# Altium footprint library AltiumLibraries.PcbLib: 247 footprints (part 14 of 16)
Each footprint in its own frame and in the unit in brackets; x right, y up, seen from the top. Pads: shape width x height; smd on the part's side, far side on the other; paste and mask are expansions set on the pad; w line width, h text height; cw(c..) or ccw(c..) is an arc to the next point about the centre after c.
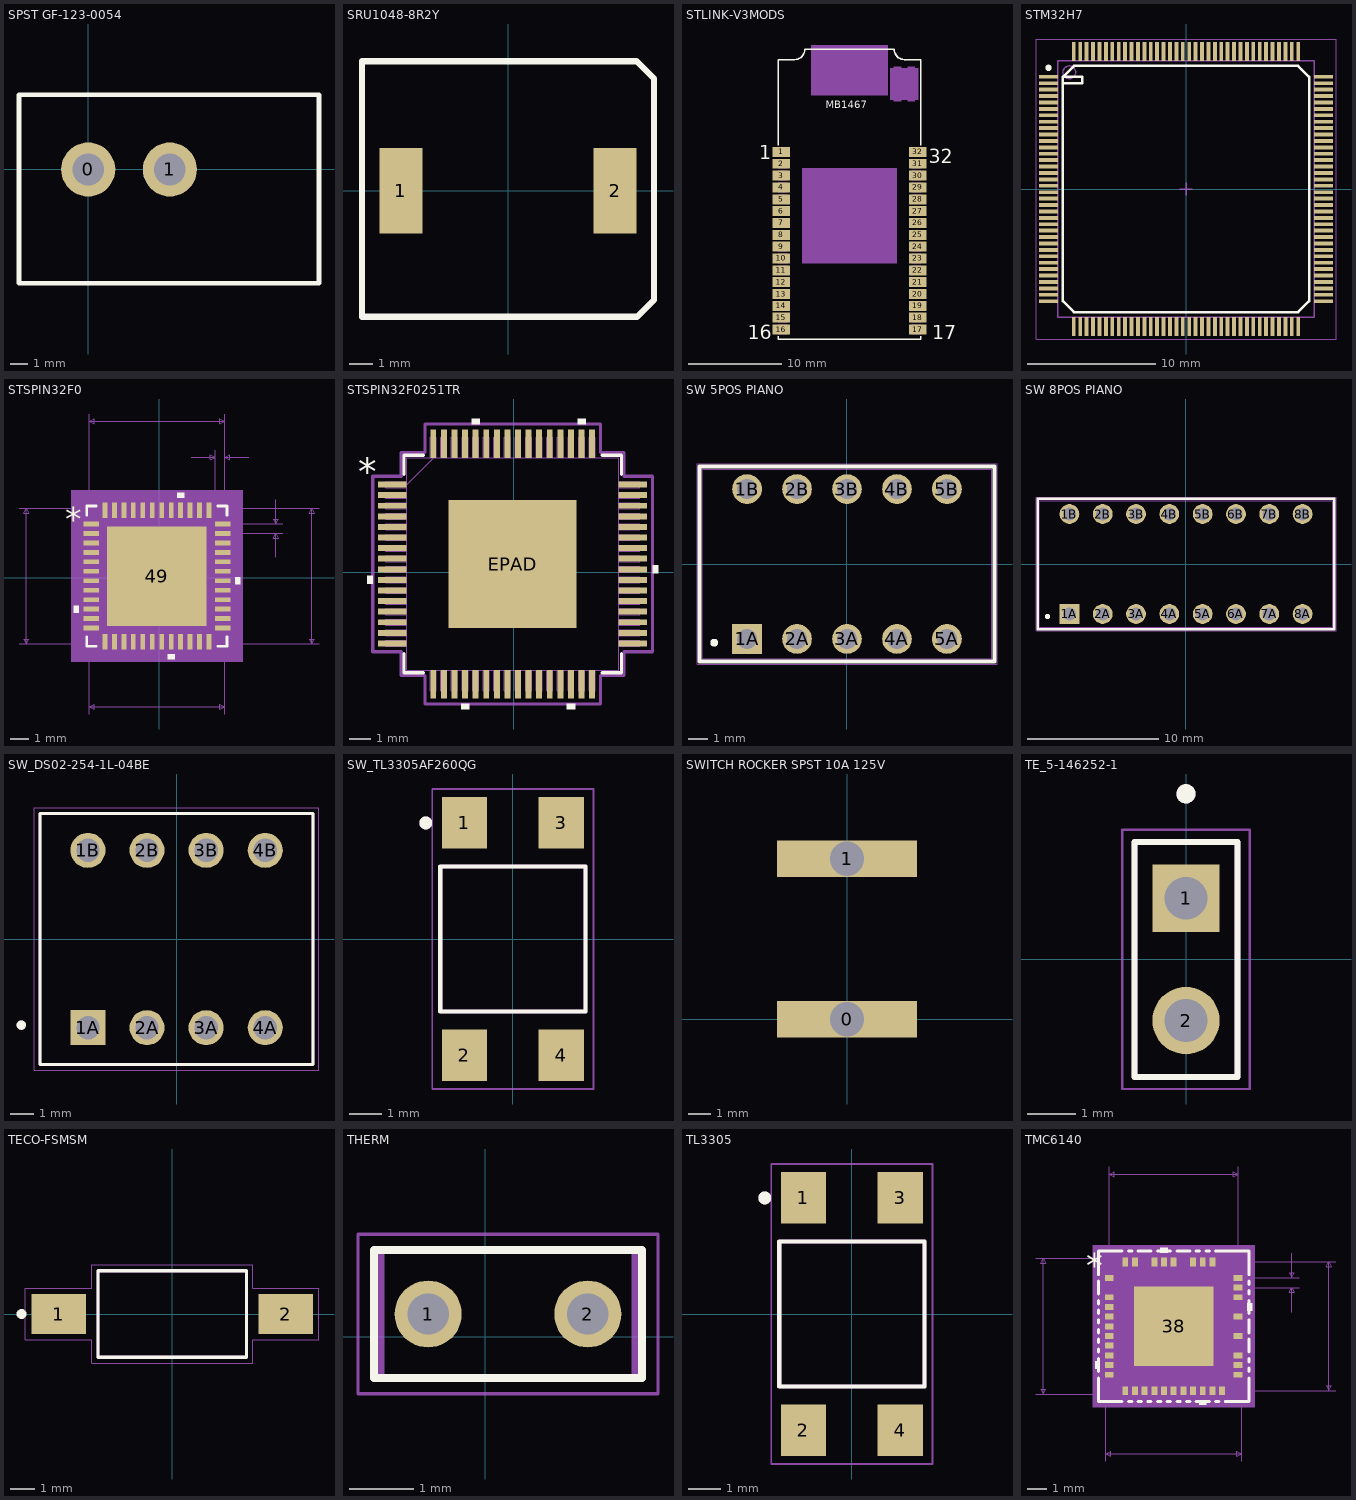
[diagram p13: the footprints below, top view; thin cyan lines are the x and y axes]

## SPST GF-123-0054 [mil]
pads (2):
  round 120 hole 70: 0(0,0) 1(181,0)
Top Overlay:
  lines w10: -153.54,-251.97 511.81,-251.97 511.81,165.35 -153.54,165.35 -153.54,-251.97
3D body "GF-123-0054--3DModel-STEP-56544.STEP": height 589, standoff -160, extent -144.86,-243.3 503.14,156.7

## SRU1048-8R2Y [mil]
pads (2):
  rect 71x142 smd: 1(-177,0) 2(177,0)
Top Overlay:
  lines w10: -241.5,-208.27 213.39,-208.27 241.5,-180.15 241.5,185.27 212.6,214.17 -241.5,214.17 -241.5,0 -241.5,-208.27

## STLINK-V3MODS [mil] "STLINK V3 COMPACT IN-CIRCUIT DEB"
pads (32):
  rect 74.8x42.13 smd: 1(1921.81,-4560) 2(1921.81,-4610) 3(1921.81,-4660) 4(1921.81,-4710) 5(1921.81,-4760) 6(1921.81,-4810) 7(1921.81,-4860) 8(1921.81,-4910) 9(1921.81,-4960) 10(1921.81,-5010) 11(1921.81,-5060) 12(1921.81,-5110) 13(1921.81,-5160) 14(1921.81,-5210) 15(1921.81,-5260) 16(1921.81,-5310) 17(2498.19,-5310) 18(2498.19,-5260) 19(2498.19,-5210) 20(2498.19,-5160) 21(2498.19,-5110) 22(2498.19,-5060) 23(2498.19,-5010) 24(2498.19,-4960) 25(2498.19,-4910) 26(2498.19,-4860) 27(2498.19,-4810) 28(2498.19,-4760) 29(2498.19,-4710) 30(2498.19,-4660) 31(2498.19,-4610) 32(2498.19,-4560)
Top Overlay:
  lines w6: 1910,-5338 1910,-5350 2510,-5350 2510,-5338 ; 1910,-4532 1910,-4170 1978,-4170 ccw(c1978,-4127) 2021,-4127 2399,-4127 ccw(c2442,-4127) 2442,-4170 2510,-4170 2510,-4532
  text "MB1467" at 2110,-4376 h31
  text "32" at 2545,-4608 h59
  text "17" at 2560,-5350 h59
  text "16" at 1780,-5350 h59
  text "1" at 1830,-4590 h59
Mechanical 15:
  drawing of 291 lines, arcs and shapes, not listed

## STM32H7 [mm] "STM32H743ZI 144 pin"
height 1.6
pads (144):
  rect 0.3x1.45 smd: BOOT0(-5.75,10.725) PA3(-8.75,-10.725) PA4(-7.25,-10.725) PA5(-6.75,-10.725) PA6(-6.25,-10.725) PA7(-5.75,-10.725) PA14(8.75,10.725) PA15(8.25,10.725) PB0(-4.25,-10.725) PB1(-3.75,-10.725) PB2(-3.25,-10.725) PB3(-3.25,10.725) PB4(-3.75,10.725) PB5(-4.25,10.725) PB6(-4.75,10.725) PB7(-5.25,10.725) PB8(-6.25,10.725) PB9(-6.75,10.725) PB10(7.25,-10.725) PB11(7.75,-10.725) PC4(-5.25,-10.725) PC5(-4.75,-10.725) PC10(7.75,10.725) PC11(7.25,10.725) PC12(6.75,10.725) PD0(6.25,10.725) PD1(5.75,10.725) PD2(5.25,10.725) PD3(4.75,10.725) PD4(4.25,10.725) PD5(3.75,10.725) PD6(2.25,10.725) PD7(1.75,10.725) PDR_ON(-8.25,10.725) PE0(-7.25,10.725) PE1(-7.75,10.725) PE7(1.75,-10.725) PE8(2.25,-10.725) PE9(2.75,-10.725) PE10(4.25,-10.725) PE11(4.75,-10.725) PE12(5.25,-10.725) PE13(5.75,-10.725) PE14(6.25,-10.725) PE15(6.75,-10.725) PF11(-2.75,-10.725) PF12(-2.25,-10.725) PF13(-0.75,-10.725) PF14(-0.25,-10.725) PF15(0.25,-10.725) PG0(0.75,-10.725) PG1(1.25,-10.725) PG9(1.25,10.725) PG10(0.75,10.725) PG11(0.25,10.725) PG12(-0.25,10.725) PG13(-0.75,10.725) PG14(-1.25,10.725) PG15(-2.75,10.725) VCAP(8.25,-10.725) VDD(-8.75,10.725) VDD(-7.75,-10.725) VDD(-2.25,10.725) VDD(-1.25,-10.725) VDD(2.75,10.725) VDD(3.75,-10.725) VDD(8.75,-10.725) VSS(-8.25,-10.725) VSS(-1.75,-10.725) VSS(-1.75,10.725) VSS(3.25,-10.725) VSS(3.25,10.725)
  rect 1.45x0.3 smd: NRST(-10.725,-3.25) PA0(-10.725,-7.75) PA1(-10.725,-8.25) PA2(-10.725,-8.75) PA8(10.725,4.75) PA9(10.725,5.25) PA10(10.725,5.75) PA11(10.725,6.25) PA12(10.725,6.75) PA13(10.725,7.25) PB12(10.725,-8.75) PB13(10.725,-8.25) PB14(10.725,-7.75) PB15(10.725,-7.25) PC0(-10.725,-3.75) PC1(-10.725,-4.25) PC2(-10.725,-4.75) PC3(-10.725,-5.25) PC6(10.725,2.75) PC7(10.725,3.25) PC8(10.725,3.75) PC9(10.725,4.25) PC13(-10.725,5.75) PC14(-10.725,5.25) PC15(-10.725,4.75) PD8(10.725,-6.75) PD9(10.725,-6.25) PD10(10.725,-5.75) PD11(10.725,-5.25) PD12(10.725,-4.75) PD13(10.725,-4.25) PD14(10.725,-2.75) PD15(10.725,-2.25) PE2(-10.725,8.75) PE3(-10.725,8.25) PE4(-10.725,7.75) PE5(-10.725,7.25) PE6(-10.725,6.75) PF0(-10.725,4.25) PF1(-10.725,3.75) PF2(-10.725,3.25) PF3(-10.725,2.75) PF4(-10.725,2.25) PF5(-10.725,1.75) PF6(-10.725,0.25) PF7(-10.725,-0.25) PF8(-10.725,-0.75) PF9(-10.725,-1.25) PF10(-10.725,-1.75) PG2(10.725,-1.75) PG3(10.725,-1.25) PG4(10.725,-0.75) PG5(10.725,-0.25) PG6(10.725,0.25) PG7(10.725,0.75) PG8(10.725,1.25) PH0(-10.725,-2.25) PH1(-10.725,-2.75) VBAT(-10.725,6.25) VCAP(10.725,7.75) VDD(-10.725,-5.75) VDD(-10.725,0.75) VDD(10.725,-3.25) VDD(10.725,8.75) VDD33USB(10.725,2.25) VDDA(-10.725,-7.25) VREF+(-10.725,-6.75) VSS(-10.725,1.25) VSS(10.725,-3.75) VSS(10.725,1.75) VSS(10.725,8.25) VSSA(-10.725,-6.25)
Top Overlay:
  circle w0.25: c-10.725,9.45 r0.125
  lines w0.2: -9.6,8.25 -8.1,8.25 -8.1,8.75 -9.6,8.75 ; -9.6,8.75 -8.75,9.6 8.75,9.6 9.6,8.75 9.6,-8.75 8.75,-9.6 -8.75,-9.6 -9.6,-8.75 -9.6,8.75
Mechanical 13:
  circle w0.1: c-9.1,9.1 r0.5
  lines w0.1: -10,-10 10,-10 10,10 -10,10 -10,-10
Mechanical 15:
  lines w0.05: -11.7,-11.7 11.7,-11.7 11.7,11.7 -11.7,11.7 -11.7,-11.7
  lines w0.1: -0.5,0 0.5,0 ; 0,-0.5 0,0.5
3D body: height 0.25, standoff 0, extent -2.54,-2.537 2.54,2.537

## STSPIN32F0 [mil]
pads (49):
  rect 32x10 smd paste+0 mask+0: 1(-141.21,111.61) 2(-141.21,91.93) 3(-141.21,72.24) 4(-141.21,52.56) 5(-141.21,32.87) 6(-141.21,13.19) 7(-141.21,-6.5) 8(-141.21,-26.18) 9(-141.21,-45.87) 10(-141.21,-65.55) 11(-141.21,-85.24) 12(-141.21,-104.92) 25(132.79,-104.92) 26(132.79,-85.24) 27(132.79,-65.55) 28(132.79,-45.87) 29(132.79,-26.18) 30(132.79,-6.5) 31(132.79,13.19) 32(132.79,32.87) 33(132.79,52.56) 34(132.79,72.24) 35(132.79,91.93) 36(132.79,111.61)
  rect 10x32 smd paste+0 mask+0: 13(-112.48,-133.65) 14(-92.8,-133.65) 15(-73.11,-133.65) 16(-53.43,-133.65) 17(-33.74,-133.65) 18(-14.06,-133.65) 19(5.63,-133.65) 20(25.32,-133.65) 21(45,-133.65) 22(64.69,-133.65) 23(84.37,-133.65) 24(104.06,-133.65) 37(104.06,140.35) 38(84.37,140.35) 39(64.69,140.35) 40(45,140.35) 41(25.32,140.35) 42(5.63,140.35) 43(-14.06,140.35) 44(-33.74,140.35) 45(-53.43,140.35) 46(-73.11,140.35) 47(-92.8,140.35) 48(-112.48,140.35)
  rect 207x207 smd paste-103 mask+0: 49(-4.21,3.35)
Top Overlay:
  region: -167.21,-58.05 -177.21,-58.05 -177.21,-73.05 -167.21,-73.05
  region: 32.81,-159.65 17.82,-159.65 17.82,-169.65 32.81,-169.65
  region: 158.79,1 168.79,1 168.79,-14 158.79,-14
  region: 52.5,166.35 37.5,166.35 37.5,176.35 52.5,176.35
  lines w6: -150.21,-123.02 -150.21,-142.65 -130.58,-142.65 ; -150.21,129.71 -150.21,149.35 -130.58,149.35 ; 122.16,-142.65 141.79,-142.65 141.79,-123.02 ; 122.16,149.35 141.79,149.35 141.79,129.71
  text "*" at -194.71,96.46 h50
Top Paste:
  region: -59.9,102.91 -103.78,102.91 -103.78,59.03 -59.9,59.03
  region: -59.9,51.16 -103.78,51.16 -103.78,7.28 -59.9,7.28
  region: -59.9,-0.59 -103.78,-0.59 -103.78,-44.47 -59.9,-44.47
  region: -59.9,-52.34 -103.78,-52.34 -103.78,-96.22 -59.9,-96.22
  region: -8.15,102.91 -52.03,102.91 -52.03,59.03 -8.15,59.03
  region: -8.15,51.16 -52.03,51.16 -52.03,7.28 -8.15,7.28
  region: -8.15,-0.59 -52.03,-0.59 -52.03,-44.47 -8.15,-44.47
  region: -8.15,-52.34 -52.03,-52.34 -52.03,-96.22 -8.15,-96.22
  region: 43.6,102.91 -0.28,102.91 -0.28,59.03 43.6,59.03
  region: 43.6,51.16 -0.28,51.16 -0.28,7.28 43.6,7.28
  region: 43.6,-0.59 -0.28,-0.59 -0.28,-44.47 43.6,-44.47
  region: 43.6,-52.34 -0.28,-52.34 -0.28,-96.22 43.6,-96.22
  region: 95.35,102.91 51.47,102.91 51.47,59.03 95.35,59.03
  region: 95.35,51.16 51.47,51.16 51.47,7.28 95.35,7.28
  region: 95.35,-0.59 51.47,-0.59 51.47,-44.47 95.35,-44.47
  region: 95.35,-52.34 51.47,-52.34 51.47,-96.22 95.35,-96.22
Mechanical 5:
  region: 173.79,-174.65 -182.21,-174.65 -182.21,181.35 173.79,181.35
Mechanical 7:
  lines w1: -291.21,-137.65 136.79,-137.65 ; -291.21,144.35 136.79,144.35 136.79,-283.65 ; -145.21,-283.65 -145.21,144.35 ; -145.21,111.61 -145.21,340.35 ; 66.79,250.35 116.79,250.35 ; 104.06,-137.65 332.79,-137.65 ; 104.06,144.35 332.79,144.35 ; 116.79,111.61 116.79,265.35 ; 132.79,91.93 257.79,91.93 ; 132.79,111.61 257.79,111.61 ; 136.79,265.35 136.79,111.61 136.79,340.35 ; 186.79,250.35 136.79,250.35 ; 242.79,41.93 242.79,91.93 ; 242.79,161.61 242.79,111.61 ; -276.21,-137.65 -276.21,144.35 ; -276.21,-137.65 -281.21,-127.65 -271.21,-127.65 -276.21,-137.65 ; -276.21,144.35 -281.21,134.35 -271.21,134.35 -276.21,144.35 ; -145.21,-268.65 136.79,-268.65 ; -145.21,-268.65 -135.21,-263.65 -135.21,-273.65 -145.21,-268.65 ; -145.21,325.35 136.79,325.35 ; -145.21,325.35 -135.21,330.35 -135.21,320.35 -145.21,325.35 ; 116.79,250.35 106.79,255.35 106.79,245.35 116.79,250.35 ; 136.79,-268.65 126.79,-263.65 126.79,-273.65 136.79,-268.65 ; 136.79,250.35 146.79,255.35 146.79,245.35 136.79,250.35 ; 136.79,325.35 126.79,330.35 126.79,320.35 136.79,325.35 ; 242.79,91.93 237.79,81.93 247.79,81.93 242.79,91.93 ; 242.79,111.61 237.79,121.61 247.79,121.61 242.79,111.61 ; 317.79,-137.65 317.79,144.35 ; 317.79,-137.65 312.79,-127.65 322.79,-127.65 317.79,-137.65 ; 317.79,144.35 312.79,134.35 322.79,134.35 317.79,144.35
  text "Default Padstyle: RX10Y32D0T" at -354.21,-459.65 h50
  text "Heat Tab Padstyle: RX207Y207D0T" at -391.71,-519.65 h50
  text "Alt 1 Padstyle: OX60Y90D30P" at -341.71,-639.65 h50
  text "Alt 2 Padstyle: OX90Y60D30P" at -341.71,-699.65 h50
  text "0.02in/0.5mm" at 262.79,89.27 h25
  text "0.02in/0.508mm" at 39.29,270.35 h25
  text "0.282in/7.163mm" at -97.96,345.35 h25
  text "0.282in/7.163mm" at 337.79,-9.15 h25
  text "0.282in/7.163mm" at -483.71,-9.15 h25
  text "0.282in/7.163mm" at -97.96,-313.65 h25
Mechanical 13:
  lines w1: -145.21,94.35 -95.21,144.35 ; -145.21,-137.65 136.79,-137.65 136.79,144.35 -145.21,144.35 -145.21,-137.65 ; -145.21,-110.92 -145.21,-98.92 -145.21,-110.92 ; -145.21,-91.24 -145.21,-79.24 -145.21,-91.24 ; -145.21,-71.55 -145.21,-59.55 -145.21,-71.55 ; -145.21,-51.87 -145.21,-39.87 -145.21,-51.87 ; -145.21,-32.18 -145.21,-20.18 -145.21,-32.18 ; -145.21,-12.5 -145.21,-0.5 -145.21,-12.5 ; -145.21,7.19 -145.21,19.19 -145.21,7.19 ; -145.21,26.87 -145.21,38.87 -145.21,26.87 ; -145.21,46.56 -145.21,58.56 -145.21,46.56 ; -145.21,66.24 -145.21,78.24 -145.21,66.24 ; -145.21,85.93 -145.21,97.93 -145.21,85.93 ; -145.21,105.61 -145.21,117.61 -145.21,105.61 ; -118.48,-137.65 -106.48,-137.65 -118.48,-137.65 ; -118.48,144.35 -106.48,144.35 -118.48,144.35 ; -98.8,-137.65 -86.8,-137.65 -98.8,-137.65 ; -98.8,144.35 -86.8,144.35 -98.8,144.35 ; -79.11,-137.65 -67.11,-137.65 -79.11,-137.65 ; -79.11,144.35 -67.11,144.35 -79.11,144.35 ; -59.43,-137.65 -47.43,-137.65 -59.43,-137.65 ; -59.43,144.35 -47.43,144.35 -59.43,144.35 ; -39.74,-137.65 -27.74,-137.65 -39.74,-137.65 ; -39.74,144.35 -27.74,144.35 -39.74,144.35 ; -20.06,-137.65 -8.06,-137.65 -20.06,-137.65 ; -20.06,144.35 -8.06,144.35 -20.06,144.35 ; -0.37,-137.65 11.63,-137.65 -0.37,-137.65 ; -0.37,144.35 11.63,144.35 -0.37,144.35 ; 19.32,-137.65 31.32,-137.65 19.32,-137.65 ; 19.32,144.35 31.32,144.35 19.32,144.35 ; 39,-137.65 51,-137.65 39,-137.65 ; 39,144.35 51,144.35 39,144.35 ; 58.69,-137.65 70.69,-137.65 58.69,-137.65 ; 58.69,144.35 70.69,144.35 58.69,144.35 ; 78.37,-137.65 90.37,-137.65 78.37,-137.65 ; 78.37,144.35 90.37,144.35 78.37,144.35 ; 98.06,-137.65 110.06,-137.65 98.06,-137.65 ; 98.06,144.35 110.06,144.35 98.06,144.35 ; 136.79,-110.92 136.79,-98.92 136.79,-110.92 ; 136.79,-91.24 136.79,-79.24 136.79,-91.24 ; 136.79,-71.55 136.79,-59.55 136.79,-71.55 ; 136.79,-51.87 136.79,-39.87 136.79,-51.87 ; 136.79,-32.18 136.79,-20.18 136.79,-32.18 ; 136.79,-12.5 136.79,-0.5 136.79,-12.5 ; 136.79,7.19 136.79,19.19 136.79,7.19 ; 136.79,26.87 136.79,38.87 136.79,26.87 ; 136.79,46.56 136.79,58.56 136.79,46.56 ; 136.79,66.24 136.79,78.24 136.79,66.24 ; 136.79,85.93 136.79,97.93 136.79,85.93 ; 136.79,105.61 136.79,117.61 136.79,105.61
  text "*" at -137.71,96.46 h50
Mechanical 15:
  region: -127.48,-147.65 -155.21,-147.65 -155.21,-119.92 -167.21,-119.92 -167.21,126.61 -155.21,126.61 -155.21,154.35 -127.48,154.35 -127.48,166.35 119.06,166.35 119.06,154.35 146.79,154.35 146.79,126.61 158.79,126.61 158.79,-119.92 146.79,-119.92 146.79,-147.65 119.06,-147.65 119.06,-159.65 -127.48,-159.65
  lines w6: -167.21,-119.92 -155.21,-119.92 -155.21,-147.65 -127.48,-147.65 -127.48,-159.65 119.06,-159.65 119.06,-147.65 146.79,-147.65 146.79,-119.92 158.79,-119.92 158.79,126.61 146.79,126.61 146.79,154.35 119.06,154.35 119.06,166.35 -127.48,166.35 -127.48,154.35 -155.21,154.35 -155.21,126.61 -167.21,126.61 -167.21,-119.92
3D body "VFQFPN48_7X7X1_STM.step": height 39.09, standoff 0, extent -145.19,-137.64 136.78,144.34
3D body: height 10, standoff 0, extent -4.21,3.35 5.79,13.35

## STSPIN32F0251TR [mil]
pads (65):
  rect 53x11 smd paste+0: 1(-225.51,163.19) 2(-225.51,143.5) 3(-225.51,123.82) 4(-225.51,104.13) 5(-225.51,84.45) 6(-225.51,64.76) 7(-225.51,45.08) 8(-225.51,25.39) 9(-225.51,5.71) 10(-225.51,-13.98) 11(-225.51,-33.66) 12(-225.51,-53.35) 13(-225.51,-73.03) 14(-225.51,-92.72) 15(-225.51,-112.4) 16(-225.51,-132.09) 33(221.49,-132.09) 34(221.49,-112.4) 35(221.49,-92.72) 36(221.49,-73.03) 37(221.49,-53.35) 38(221.49,-33.66) 39(221.49,-13.98) 40(221.49,5.71) 41(221.49,25.39) 42(221.49,45.08) 43(221.49,64.76) 44(221.49,84.45) 45(221.49,104.13) 46(221.49,123.82) 47(221.49,143.5) 48(221.49,163.19)
  rect 11x53 smd paste+0: 17(-149.65,-207.95) 18(-129.96,-207.95) 19(-110.28,-207.95) 20(-90.59,-207.95) 21(-70.91,-207.95) 22(-51.22,-207.95) 23(-31.54,-207.95) 24(-11.85,-207.95) 25(7.83,-207.95) 26(27.52,-207.95) 27(47.2,-207.95) 28(66.89,-207.95) 29(86.57,-207.95) 30(106.26,-207.95) 31(125.94,-207.95) 32(145.63,-207.95) 49(145.63,239.05) 50(125.94,239.05) 51(106.26,239.05) 52(86.57,239.05) 53(66.89,239.05) 54(47.2,239.05) 55(27.52,239.05) 56(7.83,239.05) 57(-11.85,239.05) 58(-31.54,239.05) 59(-51.22,239.05) 60(-70.91,239.05) 61(-90.59,239.05) 62(-110.28,239.05) 63(-129.96,239.05) 64(-149.65,239.05)
  rect 238x238 smd paste-118.5: EPAD(-2.01,15.55)
Top Overlay:
  region: -63.41,275.55 -78.41,275.55 -78.41,285.55 -63.41,285.55
  region: 133.44,275.55 118.44,275.55 118.44,285.55 133.44,285.55
  region: 257.99,13.21 267.99,13.21 267.99,-1.79 257.99,-1.79
  region: 113.76,-244.45 98.76,-244.45 98.76,-254.45 113.76,-254.45
  region: -83.09,-244.45 -98.09,-244.45 -98.09,-254.45 -83.09,-254.45
  region: -262.01,-6.48 -272.01,-6.48 -272.01,-21.48 -262.01,-21.48
  lines w6: -204.01,-150.69 -204.01,-186.45 -168.25,-186.45 ; -204.01,181.79 -204.01,217.55 -168.25,217.55 ; 164.23,-186.45 199.99,-186.45 199.99,-150.69 ; 164.23,217.55 199.99,217.55 199.99,181.79
  text "*" at -289.51,163.03 h50
Top Paste:
  region: 113.06,-47.89 61.43,-47.89 61.43,-99.51 113.06,-99.51
  region: 113.06,11.61 61.43,11.61 61.43,-40.01 113.06,-40.01
  region: 113.06,71.11 61.43,71.11 61.43,19.49 113.06,19.49
  region: 113.06,130.61 61.43,130.61 61.43,78.99 113.06,78.99
  region: 53.56,-47.89 1.93,-47.89 1.93,-99.51 53.56,-99.51
  region: 53.56,11.61 1.93,11.61 1.93,-40.01 53.56,-40.01
  region: 53.56,71.11 1.93,71.11 1.93,19.49 53.56,19.49
  region: 53.56,130.61 1.93,130.61 1.93,78.99 53.56,78.99
  region: -5.94,-47.89 -57.57,-47.89 -57.57,-99.51 -5.94,-99.51
  region: -5.94,11.61 -57.57,11.61 -57.57,-40.01 -5.94,-40.01
  region: -5.94,71.11 -57.57,71.11 -57.57,19.49 -5.94,19.49
  region: -5.94,130.61 -57.57,130.61 -57.57,78.99 -5.94,78.99
  region: -65.44,-47.89 -117.07,-47.89 -117.07,-99.51 -65.44,-99.51
  region: -65.44,11.61 -117.07,11.61 -117.07,-40.01 -65.44,-40.01
  region: -65.44,71.11 -117.07,71.11 -117.07,19.49 -65.44,19.49
  region: -65.44,130.61 -117.07,130.61 -117.07,78.99 -65.44,78.99
Mechanical 13:
  drawing of 261 lines, arcs and shapes, not listed
  text "*" at -196.51,148.03 h50
Mechanical 15:
  lines w6: -262.01,-147.59 -262.01,178.69 -209.01,178.69 -209.01,222.55 -165.15,222.55 -165.15,275.55 161.13,275.55 161.13,222.55 204.99,222.55 204.99,178.69 257.99,178.69 257.99,-147.59 204.99,-147.59 204.99,-191.45 161.13,-191.45 161.13,-244.45 -165.15,-244.45 -165.15,-191.45 -209.01,-191.45 -209.01,-147.59 -262.01,-147.59
3D body: height 10, standoff 0, extent -2.01,15.55 7.99,25.55
3D body "TQFP64_10X10_STM.step": height 47.09, standoff 0, extent -237.98,-220.43 233.98,251.54

## SW 5POS PIANO [mm]
pads (10):
  rect 1.508x1.508 hole 1: 1A(-5.08,-3.81)
  round 1.508 hole 1: 1B(-5.08,3.81) 2A(-2.54,-3.81) 2B(-2.54,3.81) 3A(0,-3.81) 3B(0,3.81) 4A(2.54,-3.81) 4B(2.54,3.81) 5A(5.08,-3.81) 5B(5.08,3.81)
Top Overlay:
  circle w0.2: c-6.75,-4 r0.1
  lines w0.2: -7.5,-4.96 7.5,-4.96 7.5,4.96 -7.5,4.96 -7.5,-4.96
Mechanical 13:
  lines w0.05: -7.366,-4.826 7.366,-4.826 7.366,4.826 -7.366,4.826 -7.366,-4.826
Mechanical 15:
  lines w0.05: -7.625,-5.085 7.625,-5.085 7.625,5.085 -7.625,5.085 -7.625,-5.085

## SW 8POS PIANO [mm]
pads (16):
  rect 1.508x1.508 hole 1: 1A(-8.89,-3.81)
  round 1.508 hole 1: 1B(-8.89,3.81) 2A(-6.35,-3.81) 2B(-6.35,3.81) 3A(-3.81,-3.81) 3B(-3.81,3.81) 4A(-1.27,-3.81) 4B(-1.27,3.81) 5A(1.27,-3.81) 5B(1.27,3.81) 6A(3.81,-3.81) 6B(3.81,3.81) 7A(6.35,-3.81) 7B(6.35,3.81) 8A(8.89,-3.81) 8B(8.89,3.81)
Top Overlay:
  circle w0.2: c-10.56,-4 r0.1
  lines w0.2: -11.31,-4.96 11.31,-4.96 11.31,4.96 -11.31,4.96 -11.31,-4.96
Mechanical 13:
  lines w0.05: -11.176,-4.826 11.176,-4.826 11.176,4.826 -11.176,4.826 -11.176,-4.826
Mechanical 15:
  lines w0.05: -11.435,-5.085 11.435,-5.085 11.435,5.085 -11.435,5.085 -11.435,-5.085
3D body "76psb08t.STEP": height 7.77, standoff -3.3, extent -11.176,-4.826 11.176,4.826

## SW_DS02-254-1L-04BE [mm]
pads (8):
  rect 1.508x1.508 hole 1: 1A(-3.81,-3.81)
  round 1.508 hole 1: 1B(-3.81,3.81) 2A(-1.27,-3.81) 2B(-1.27,3.81) 3A(1.27,-3.81) 3B(1.27,3.81) 4A(3.81,-3.81) 4B(3.81,3.81)
Top Overlay:
  circle w0.2: c-6.67,-3.7 r0.1
  lines w0.127: -5.87,-5.4 -5.87,5.4 5.87,5.4 5.87,-5.4 -5.87,-5.4
Mechanical 13:
  circle w0.2: c-6.67,-3.7 r0.1
  lines w0.127: -5.87,-5.4 -5.87,5.4 5.87,5.4 5.87,-5.4 -5.87,-5.4
Mechanical 15:
  lines w0.05: -6.12,-5.65 6.12,-5.65 6.12,5.65 -6.12,5.65 -6.12,-5.65
3D body "CUI_DEVICES_DS02-254-1L-04BE.step": height 9.46, standoff -3.8, extent -5.867,-7.71 5.863,5.17

## SW_TL3305AF260QG [mm]
pads (4):
  rect 1.4x1.6 smd: 1(-1.5,3.6) 2(-1.5,-3.6) 3(1.5,3.6) 4(1.5,-3.6)
Top Overlay:
  circle w0.2: c-2.7,3.6 r0.1
  lines w0.127: -2.25,-2.25 -2.25,2.25 2.25,2.25 2.25,-2.25 -2.25,-2.25
Mechanical 13:
  circle w0.2: c-2.7,3.6 r0.1
  lines w0.127: -2.25,-2.25 -2.25,2.25 2.25,2.25 2.25,-2.25 -2.25,-2.25
Mechanical 15:
  lines w0.05: -2.5,-4.65 -2.5,4.65 2.5,4.65 2.5,-4.65 -2.5,-4.65
3D body "TL3305AF260QG--3DModel-STEP-1.STEP": height 3.7, standoff -0.1, extent -2.25,-3.75 2.25,3.75

## SWITCH ROCKER SPST 10A 125V [mm]
pads (2):
  rect 6.1x1.6 hole 1.5 square: 0(0,0) 1(0,7)
3D body: height 13.69, standoff 0, extent -7.3,-3.1 7.3,15.9

## TE_5-146252-1 [mm]
pads (2):
  rect 1.398x1.398 hole 0.89: 1(0,1.27)
  round 1.398 hole 0.89: 2(0,-1.27)
Top Overlay:
  circle w0.2: c0,3.44 r0.1
  lines w0.127: -1.07,-2.44 -1.07,2.44 1.07,2.44 1.07,-2.44 -1.07,-2.44
Mechanical 13:
  circle w0.2: c0,3.44 r0.1
  lines w0.127: -1.07,-2.44 -1.07,2.44 1.07,2.44 1.07,-2.44 -1.07,-2.44
Mechanical 15:
  lines w0.05: -1.32,-2.69 -1.32,2.69 1.32,2.69 1.32,-2.69 -1.32,-2.69
3D body "5-146252-1--3DModel-STEP-1.STEP": height 10.58, standoff -2.96, extent -1.067,-2.438 1.067,2.438
3D body "SNT-100-BK-G.stp": height 8.6, standoff 2.5, extent -1.27,-2.388 1.27,2.692

## TECO-FSMSM [mm]
pads (2):
  rect 2.19x1.6 smd: 1(-4.59,0) 2(4.59,0)
Top Overlay:
  circle w0.2: c-6.096,0 r0.1
  lines w0.127: -3,-1.75 -3,1.75 3,1.75 3,-1.75 -3,-1.75
Mechanical 13:
  lines w0.127: -3,-1.75 -3,1.75 3,1.75 3,-1.75 -3,-1.75
Mechanical 15:
  lines w0.05: -5.935,-1.05 -3.25,-1.05 -3.25,-2 3.25,-2 3.25,-1.05 5.935,-1.05 5.935,1.05 3.25,1.05 3.25,2 -3.25,2 -3.25,1.05 -5.935,1.05 -5.935,-1.05

## THERM [mm]
pads (2):
  round 1.05 hole 0.65: 1(-0.894,0.356) 2(1.606,0.356)
Top Overlay:
  lines w0.127: -1.744,-0.644 2.456,-0.644 2.456,1.356 -1.744,1.356 -1.744,-0.644
Mechanical 13:
  lines w0.127: -1.644,-0.644 -1.644,1.356 2.356,1.356 2.356,-0.644 -1.644,-0.644
Mechanical 15:
  lines w0.05: -1.994,-0.894 -1.994,1.606 2.706,1.606 2.706,-0.894 -1.994,-0.894

## TL3305 [mm] "TL3305 SPST-NO"
pads (4):
  rect 1.4x1.6 smd: 1(-1.5,3.6) 2(-1.5,-3.6) 3(1.5,3.6) 4(1.5,-3.6)
Top Overlay:
  circle w0.2: c-2.7,3.6 r0.1
  lines w0.127: -2.25,-2.25 2.25,-2.25 2.25,2.25 -2.25,2.25 -2.25,-2.25
Mechanical 13:
  circle w0.2: c-2.7,3.6 r0.1
  lines w0.127: -2.25,-2.25 2.25,-2.25 2.25,2.25 -2.25,2.25 -2.25,-2.25
Mechanical 15:
  lines w0.05: -2.5,-4.65 2.5,-4.65 2.5,4.65 -2.5,4.65 -2.5,-4.65

## TMC6140 [mil]
pads (38):
  rect 18x12 smd paste-6 mask+0: 1(2024.09,1778.45) 2(2024.09,1739.07) 3(2024.09,1719.38) 4(2024.09,1699.69) 5(2024.09,1680) 6(2024.09,1660.31) 7(2024.09,1640.62) 8(2024.09,1620.93) 9(2024.09,1601.24) 10(2024.09,1581.55) 22(2285.91,1581.55) 23(2285.91,1601.24) 24(2285.91,1620.93) 25(2285.91,1660.31) 26(2285.91,1699.69) 27(2285.91,1739.07) 28(2285.91,1758.76) 29(2285.91,1778.45)
  rect 12x18 smd paste-6 mask+0: 11(2056.55,1549.1) 12(2076.24,1549.1) 13(2095.93,1549.1) 14(2115.62,1549.1) 15(2135.31,1549.1) 16(2155,1549.1) 17(2174.69,1549.1) 18(2194.38,1549.1) 19(2214.07,1549.1) 20(2233.76,1549.1) 21(2253.45,1549.1) 30(2233.76,1810.9) 31(2214.07,1810.9) 32(2194.38,1810.9) 33(2155,1810.9) 34(2135.31,1810.9) 35(2115.62,1810.9) 36(2076.24,1810.9) 37(2056.55,1810.9)
  rect 161x161 smd paste-80.5 mask+0: 38(2155,1680)
Top Overlay:
  region: 2005.09,1608.74 1995.09,1608.74 1995.09,1593.74 2005.09,1593.74
  region: 2221.57,1530.1 2206.57,1530.1 2206.57,1520.1 2221.57,1520.1
  region: 2304.91,1726.88 2314.91,1726.88 2314.91,1711.88 2304.91,1711.88
  region: 2142.81,1829.9 2127.81,1829.9 2127.81,1839.9 2142.81,1839.9
  lines w6: 2002,1575.17 2002,1527 2050.19,1527 ; 2002,1587.93 2002,1594.86 ; 2002,1607.62 2002,1614.55 ; 2002,1627.31 2002,1634.24 ; 2002,1647 2002,1653.93 ; 2002,1666.69 2002,1673.62 ; 2002,1686.38 2002,1693.31 ; 2002,1706.07 2002,1713 ; 2002,1725.76 2002,1732.69 ; 2002,1745.45 2002,1772.07 ; 2002,1784.83 2002,1833 2050.19,1833 ; 2062.91,1527 2069.88,1527 ; 2062.91,1833 2069.88,1833 ; 2082.6,1527 2089.57,1527 ; 2082.6,1833 2109.26,1833 ; 2102.29,1527 2109.26,1527 ; 2121.98,1527 2128.95,1527 ; 2121.98,1833 2128.95,1833 ; 2141.67,1527 2148.64,1527 ; 2141.67,1833 2148.64,1833 ; 2161.36,1527 2168.33,1527 ; 2161.36,1833 2188.02,1833 ; 2181.05,1527 2188.02,1527 ; 2200.74,1527 2207.71,1527 ; 2200.74,1833 2207.71,1833 ; 2220.43,1527 2227.4,1527 ; 2220.43,1833 2227.4,1833 ; 2240.12,1527 2247.09,1527 ; 2240.12,1833 2308,1833 2308,1784.83 ; 2259.81,1527 2308,1527 2308,1575.17 ; 2308,1587.93 2308,1594.86 ; 2308,1607.62 2308,1614.55 ; 2308,1627.31 2308,1653.93 ; 2308,1666.69 2308,1693.31 ; 2308,1706.07 2308,1732.69 ; 2308,1745.45 2308,1752.38 ; 2308,1765.14 2308,1772.07
  text "*" at 1977.59,1778.3 h50
Top Paste:
  region: 2124.23,1756.56 2078.44,1756.56 2078.44,1710.77 2124.23,1710.77
  region: 2124.23,1702.9 2078.44,1702.9 2078.44,1657.1 2124.23,1657.1
  region: 2124.23,1649.23 2078.44,1649.23 2078.44,1603.44 2124.23,1603.44
  region: 2177.9,1756.56 2132.1,1756.56 2132.1,1710.77 2177.9,1710.77
  region: 2177.9,1702.9 2132.1,1702.9 2132.1,1657.1 2177.9,1657.1
  region: 2177.9,1649.23 2132.1,1649.23 2132.1,1603.44 2177.9,1603.44
  region: 2231.56,1756.56 2185.77,1756.56 2185.77,1710.77 2231.56,1710.77
  region: 2231.56,1702.9 2185.77,1702.9 2185.77,1657.1 2231.56,1657.1
  region: 2231.56,1649.23 2185.77,1649.23 2185.77,1603.44 2231.56,1603.44
Mechanical 5:
  region: 2319.91,1515.1 1990.09,1515.1 1990.09,1844.9 2319.91,1844.9
Mechanical 7:
  lines w1: 1875.09,1542 2293,1542 ; 1875.09,1818 2293,1818 2293,1406 ; 2017,1406 2017,1818 ; 2024.09,1778.45 2024.09,2004 ; 2253.45,1549.1 2484.91,1549.1 ; 2253.45,1810.9 2484.91,1810.9 ; 2285.91,1758.76 2409.91,1758.76 ; 2285.91,2004 2285.91,1778.45 2409.91,1778.45 ; 2394.91,1708.76 2394.91,1758.76 ; 2394.91,1828.45 2394.91,1778.45 ; 1890.09,1542 1890.09,1818 ; 1890.09,1542 1885.09,1552 1895.09,1552 1890.09,1542 ; 1890.09,1818 1885.09,1808 1895.09,1808 1890.09,1818 ; 2017,1421 2293,1421 ; 2017,1421 2027,1426 2027,1416 2017,1421 ; 2024.09,1989 2285.91,1989 ; 2024.09,1989 2034.09,1994 2034.09,1984 2024.09,1989 ; 2285.91,1989 2275.91,1994 2275.91,1984 2285.91,1989 ; 2293,1421 2283,1426 2283,1416 2293,1421 ; 2394.91,1758.76 2389.91,1748.76 2399.91,1748.76 2394.91,1758.76 ; 2394.91,1778.45 2389.91,1788.45 2399.91,1788.45 2394.91,1778.45 ; 2469.91,1549.1 2469.91,1810.9 ; 2469.91,1549.1 2464.91,1559.1 2474.91,1559.1 2469.91,1549.1 ; 2469.91,1810.9 2464.91,1800.9 2474.91,1800.9 2469.91,1810.9
  text "Default Padstyle: RX12Y18D0T" at 1805,1296 h50
  text "Heat Tab Padstyle: RX161Y161D0T" at 1767.5,1236 h50
  text "Alt 1 Padstyle: OX60Y90D30P" at 1817.5,1116 h50
  text "Alt 2 Padstyle: OX90Y60D30P" at 1817.5,1056 h50
  text "0.02in/0.5mm" at 2414.91,1756.11 h25
  text "0.262in/6.65mm" at 2067.5,2009 h25
  text "0.262in/6.65mm" at 2489.91,1667.5 h25
  text "0.276in/7.01mm" at 1695.09,1667.5 h25
  text "0.276in/7.01mm" at 2067.5,1376 h25
Mechanical 13:
  lines w1: 2017,1768 2067,1818 ; 2017,1542 2293,1542 2293,1818 2017,1818 2017,1542
  text "*" at 2030.59,1763.3 h50
Mechanical 15:
  region: 2040.55,1532 2007,1532 2007,1565.55 2005.09,1565.55 2005.09,1794.45 2007,1794.45 2007,1828 2040.55,1828 2040.55,1829.9 2269.45,1829.9 2269.45,1828 2303,1828 2303,1794.45 2304.91,1794.45 2304.91,1565.55 2303,1565.55 2303,1532 2269.45,1532 2269.45,1530.1 2040.55,1530.1
  lines w6: 2005.09,1565.55 2007,1565.55 2007,1532 2040.55,1532 2040.55,1530.1 2269.45,1530.1 2269.45,1532 2303,1532 2303,1565.55 2304.91,1565.55 2304.91,1794.45 2303,1794.45 2303,1828 2269.45,1828 2269.45,1829.9 2040.55,1829.9 2040.55,1828 2007,1828 2007,1794.45 2005.09,1794.45 2005.09,1565.55
3D body: height 10, standoff 0, extent 2155,1680 2165,1690
3D body "QFN_140-LA_TRI.step": height 35.12, standoff 0, extent 2015.01,1540.01 2295.01,1820.01